# Altium footprint library Connect.PcbLib: 272 footprints (part 17 of 17)
Each footprint in its own frame and in the unit in brackets; x right, y up, seen from the top. Pads: shape width x height; smd on the part's side, far side on the other; paste and mask are expansions set on the pad; w line width, h text height; cw(c..) or ccw(c..) is an arc to the next point about the centre after c.
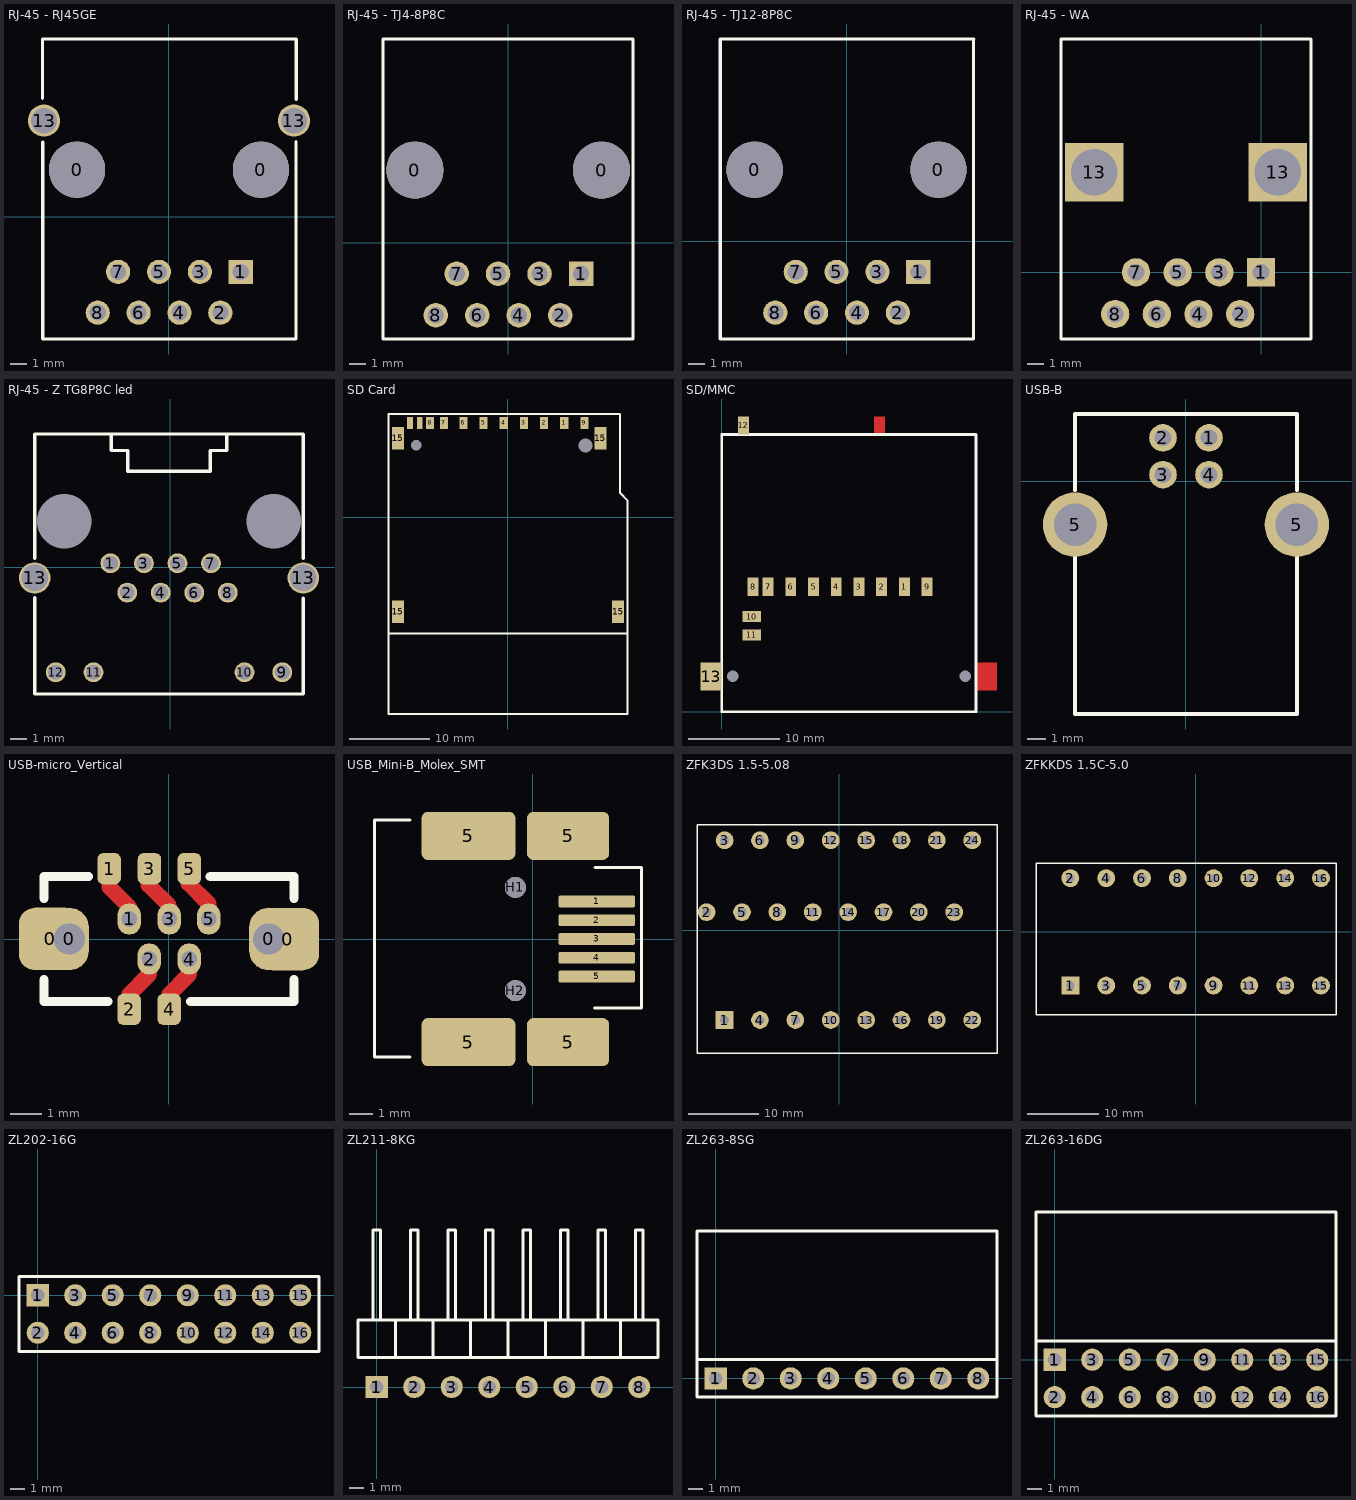
[diagram p16: the footprints below, top view; thin cyan lines are the x and y axes]

## RJ-45 - RJ45GE [mm]
pads (12):
  round 3.5 hole 3.5 unplated: 0(-5.715,2.92) 0(5.715,2.92)
  rect 1.5x1.5 hole 1: 1(4.46,-3.43)
  round 1.5 hole 1: 2(3.19,-5.97) 3(1.92,-3.43) 4(0.65,-5.97) 5(-0.62,-3.43) 6(-1.89,-5.97) 7(-3.16,-3.43) 8(-4.43,-5.97)
  round 2 hole 1.6: 13(-7.77,5.97) 13(7.77,5.97)
Top Overlay:
  lines w0.2: -7.86,7.345 -7.86,11.045 4.74,11.045 7.915,11.045 7.915,7.295 ; -7.855,4.645 -7.855,-7.605 7.895,-7.605 7.895,4.67
3D body "RJ-45 (TJ7-8P8C).STEP": height 13.7, standoff -4, extent -7.975,-7.725 8.025,13.675

## RJ-45 - TJ4-8P8C [mm]
height 11.5
pads (10):
  round 3.5 hole 3.5 unplated: 0(-5.715,4.445) 0(5.715,4.445)
  rect 1.5x1.5 hole 1: 1(4.46,-1.905)
  round 1.5 hole 1: 2(3.19,-4.445) 3(1.92,-1.905) 4(0.65,-4.445) 5(-0.62,-1.905) 6(-1.89,-4.445) 7(-3.16,-1.905) 8(-4.43,-4.445)
Top Overlay:
  lines w0.2: -7.675,-5.9 -7.675,12.475 7.65,12.475 7.65,-5.9 -7.675,-5.9
3D body: height 11.5, standoff 10, extent -7.485,-5.75 0,12.325
3D body: height 0.5, standoff -3.5, extent -7.215,2.945 -4.215,5.945
3D body: height 0.5, standoff 0, extent -7.485,9.75 -3,12.325
3D body: height 0.5, standoff 0, extent -6.635,-4.75 -5.635,2
3D body: height 0.5, standoff 0, extent -4.385,1 4.385,2
3D body: height 2, standoff 0.5, extent -7.485,-5.75 -4.885,12.325
3D body: height 11, standoff 0.5, extent -7.485,-5.75 -6.197,12.325
3D body: height 11, standoff 0.5, extent -7.485,-5.75 7.485,2
3D body: height 11, standoff 0.5, extent 6.197,-5.75 7.485,12.325
3D body: height 2, standoff 0.5, extent 4.885,-5.75 7.485,12.325
3D body: height 0.5, standoff 0, extent 5.635,-4.75 6.635,2
3D body: height 0.5, standoff 0, extent 3,9.75 7.485,12.325
3D body: height 0.5, standoff -3.5, extent 4.215,2.945 7.215,5.945
3D body: height 11.5, standoff 10, extent 0,-5.75 7.485,12.325
3D body: height 1, standoff -3, extent -3.508,-2.254 -2.81,-1.555
3D body: height 1, standoff -3, extent -4.778,-4.794 -4.08,-4.095
3D body: height 1, standoff -3, extent -0.97,-2.255 -0.272,-1.556
3D body: height 1, standoff -3, extent -2.24,-4.795 -1.542,-4.096
3D body: height 1, standoff -3, extent 0.3,-4.795 0.998,-4.096
3D body: height 1, standoff -3, extent 1.57,-2.255 2.268,-1.556
3D body: height 1, standoff -3, extent 4.11,-2.255 4.808,-1.556
3D body: height 1, standoff -3, extent 2.84,-4.795 3.538,-4.096

## RJ-45 - TJ12-8P8C [mm]
pads (10):
  round 3.5 hole 3.5 unplated: 0(-5.715,4.445) 0(5.715,4.445)
  rect 1.5x1.5 hole 1: 1(4.46,-1.905)
  round 1.5 hole 1: 2(3.19,-4.445) 3(1.92,-1.905) 4(0.65,-4.445) 5(-0.62,-1.905) 6(-1.89,-4.445) 7(-3.16,-1.905) 8(-4.43,-4.445)
Top Overlay:
  lines w0.2: -7.86,12.57 4.74,12.57 7.915,12.57 ; -7.855,12.57 -7.855,-6.08 7.895,-6.08 7.895,12.57
3D body "RJ-45_TJ12-8P8C.STEP": height 12.7, standoff -3.36, extent -7.575,-5.844 7.665,12.444

## RJ-45 - WA [mm]
pads (10):
  rect 1.7x1.7 hole 1: 1(0,0)
  round 1.7 hole 1: 2(-1.25,-2.5) 3(-2.5,0) 4(-3.75,-2.5) 5(-5,0) 6(-6.25,-2.5) 7(-7.5,0) 8(-8.75,-2.5)
  rect 3.5x3.5 hole 2.8 unplated: 13(-10,6) 13(1,6)
Top Overlay:
  lines w0.2: -12,-4 -12,14 3,14 3,-4 -12,-4

## RJ-45 - Z TG8P8C led [mm]
pads (16):
  round 0 hole 3.3: 0(-6.425,2.795) 0(6.275,2.795)
  round 1.2 hole 0.9 unplated: 1(-3.625,0.255) 9(6.785,-6.345) 10(4.495,-6.345) 11(-4.645,-6.345) 12(-6.935,-6.345)
  round 1.2 hole 0.9 unplated paste+0: 2(-2.605,-1.525) 3(-1.595,0.255) 4(-0.575,-1.525) 5(0.435,0.255) 6(1.455,-1.525) 7(2.465,0.255) 8(3.485,-1.525)
  round 1.9 hole 1.6: 13(-8.205,-0.635) 13(8.055,-0.635)
Top Overlay:
  lines w0.2: -8.21,0.55 -8.21,8.085 ; -8.205,-1.825 -8.205,-7.665 8.055,-7.665 8.055,-1.85 ; -8.205,8.085 8.055,8.085 8.05,8.085 8.05,0.55 ; -3.575,8.085 -3.575,7.075 -2.575,7.075 -2.575,5.825 2.425,5.825 2.425,7.075 3.425,7.075 3.425,8.075 ; 2.535,8.085 2.635,8.085 ; 4.685,8.085 4.785,8.085
3D body "RJ-45 - Z TG8P8C.STEP": height 14.6, standoff -4.12, extent -9.339,-7.65 9.289,9.071

## SD Card [mm]
pads (17):
  round 0 hole 1.3: 0(-11.4,8.9)
  round 0 hole 1.7: 0(9.6,8.9)
  rect 1x1.5 smd: 1(6.975,11.7) 2(4.475,11.7) 3(1.975,11.7) 4(-0.525,11.7) 5(-3.025,11.7) 6(-5.525,11.7) 7(-7.95,11.7) 8(-9.65,11.7) 9(9.475,11.7)
  rect 0.7x1.5 smd: 11(-10.95,11.7) 14(-12.15,11.7)
  rect 1.5x2.8 smd: 15(-13.65,-11.7) 15(-13.65,9.8) 15(11.45,9.8) 15(13.65,-11.7)
Top Overlay:
  lines w0.25: -14.8,-14.4 -14.8,-24.4 14.8,-24.4 14.8,-14.4
  lines w0.254: -14.8,-14.4 -14.8,12.8 13.9,12.8 13.9,3 14.8,2.1 14.8,-14.4 -14.8,-14.4
3D body "SD Card Connector.STEP": height 3.4, standoff -0.5, extent -13.913,-14.075 14.063,12.175
3D body "User Library-SD Card-1.STEP": height 2.15, standoff 0.85, extent -12,-24.25 12,7.75

## SD/MMC [mm]
height 3.3
pads (15):
  round 0 hole 1.3: 0(1.2,3.9) 0(26.8,3.9)
  rect 1.2x2 smd: 1(20.1,13.75) 2(17.6,13.75) 3(15.1,13.75) 4(12.6,13.75) 5(10.1,13.75) 6(7.6,13.75) 7(5.1,13.75) 8(3.45,13.75) 9(22.6,13.75) 12(2.375,31.5)
  rect 2x1.2 smd: 10(3.3,10.45) 11(3.3,8.45)
  rect 2.3x3.1 smd: 13(-1.175,3.85)
Top Layer:
  rectangle: 28,2.3 30.3,5.4
  region: 17.95,30.5 17.95,32.5 16.75,32.5 16.75,30.5
Top Overlay:
  lines w0.3: 0,0 28,0 28,30.5 0,30.5 0,0

## USB-B [mm]
height 10.6
pads (6):
  round 1.5 hole 0.9: 1(1.25,2.355) 2(-1.25,2.355) 3(-1.25,0.355) 4(1.25,0.355)
  round 3.5 hole 2.3: 5(-6.02,-2.355) 5(6.02,-2.355)
Top Overlay:
  lines w0.2: -6.02,-4.105 -6.02,-12.635 6.02,-12.635 6.02,-4.105 ; -6.02,-0.5 -6.02,3.645 6.02,3.645 6.02,-0.5
3D body "USB-B-S-X-W-TH.STEP": height 11, standoff -3.64, extent -7.4,-12.7 7.399,3.8

## USB-micro_Vertical [mm]
height 10
pads (14):
  rrect50% 2x2 smd: 0(-3.8,0) 0(3.8,0)
  oval 1.25x2 hole 1: 0(-3.19,0) 0(3.19,0)
  rrect50% 0.75x1 smd: 1(-1.915,2.25) 2(-1.275,-2.25) 3(-0.625,2.25) 4(0.005,-2.25) 5(0.65,2.25)
  oval 0.75x1 hole 0.5: 1(-1.27,0.64) 2(-0.63,-0.64) 3(0.01,0.64) 4(0.65,-0.64) 5(1.27,0.64)
Top Layer:
  lines w0.5: -1.915,2.35 -1.915,1.665 -1.27,1.02 -1.27,0.64 ; -1.275,-2.35 -1.275,-1.775 -0.63,-1.13 -0.63,-0.64 ; -0.655,2.35 -0.655,1.73 -0.01,1.085 -0.01,0.64 ; 0.005,-2.35 0.005,-1.775 0.65,-1.13 0.65,-0.64 ; 0.625,2.35 0.625,1.775 1.27,1.13 1.27,0.64
Top Overlay:
  lines w0.3: -4,-1.3 -4,-2 -1.95,-2 ; -4,1.3 -4,2 -2.575,2 ; 0.7,-2 4,-2 4,-1.3 ; 1.325,2 4,2 4,1.3
3D body: height 2, standoff 0, extent -1.635,-1.875 -0.885,-1.85
3D body: height 2, standoff 0, extent -0.355,-1.875 0.395,-1.85
3D body: height 2, standoff 0, extent 0.265,1.85 1.015,1.875
3D body: height 2, standoff 0, extent -0.995,1.85 -0.245,1.875
3D body: height 2, standoff 0, extent -2.275,1.85 -1.525,1.875
3D body: height 3.3, standoff 0, extent -3.85,-1.85 3.85,1.85
3D body: height 11, standoff 0.4, extent -3.425,-0.9 3.425,0.9

## USB_Mini-B_Molex_SMT [mm]
height 3.95
pads (11):
  rrect25% 3.25x0.5 smd: 1(2.738,1.6) 2(2.738,0.8) 3(2.738,0) 4(2.738,-0.8) 5(2.738,-1.6)
  rrect25% 4x2.05 smd: 5(-2.737,-4.4) 5(-2.737,4.4)
  rrect25% 3.5x2.05 smd: 5(1.513,-4.4) 5(1.513,4.4)
  round 0.9 hole 0.9 unplated: H1(-0.737,2.2) H2(-0.737,-2.2)
Top Overlay:
  lines w0.127: -5.237,-5.025 -6.737,-5.025 -6.737,5.075 -5.237,5.075 ; 2.638,-2.95 4.638,-2.95 4.638,3.05 2.663,3.05
3D body "usb_a-usb_b-m5-smd-c.stp": height 3.93, standoff -1, extent -6.662,-4.925 2.587,4.975

## ZFK3DS 1.5-5.08 [mm]
height 36.6
pads (24):
  rect 2.5x2.5 hole 1.3: 1(-16.23,-12.7)
  round 2.5 hole 1.3: 2(-18.77,2.54) 3(-16.23,12.7) 4(-11.23,-12.7) 5(-13.77,2.54) 6(-11.23,12.7) 7(-6.23,-12.7) 8(-8.77,2.54) 9(-6.23,12.7) 10(-1.23,-12.7) 11(-3.77,2.54) 12(-1.23,12.7) 13(3.77,-12.7) 14(1.23,2.54) 15(3.77,12.7) 16(8.77,-12.7) 17(6.23,2.54) 18(8.77,12.7) 19(13.77,-12.7) 20(11.23,2.54) 21(13.77,12.7) 22(18.77,-12.7) 23(16.23,2.54) 24(18.77,12.7)
Top Overlay:
  lines w0.2: -20.13,-17.4 22.27,-17.4 22.27,14.9 -20.13,14.9 -20.13,-17.4
3D body "ZFK3DS 1,5-5,08.stp": height 36.6, standoff -3.5, extent -20.045,-17.35 -13.165,14.85
3D body "ZFK3DS 1,5-5,08.stp": height 36.6, standoff -3.5, extent -15.045,-17.35 -8.165,14.85
3D body "ZFK3DS 1,5-5,08.stp": height 36.6, standoff -3.5, extent -10.045,-17.35 -3.165,14.85
3D body "ZFK3DS 1,5-5,08.stp": height 36.6, standoff -3.5, extent -5.045,-17.35 1.835,14.85
3D body "ZFK3DS 1,5-5,08.stp": height 36.6, standoff -3.5, extent -0.045,-17.35 6.835,14.85
3D body "ZFK3DS 1,5-5,08.stp": height 36.6, standoff -3.5, extent 4.955,-17.35 11.835,14.85
3D body "ZFK3DS 1,5-5,08.stp": height 36.6, standoff -3.5, extent 9.955,-17.35 16.835,14.85
3D body "ZFK3DS 1,5-5,08.stp": height 36.6, standoff -3.5, extent 14.955,-17.35 21.835,14.85

## ZFKKDS 1.5C-5.0 [mm]
height 26
pads (16):
  rect 2.5x2.5 hole 1.2: 1(-17.5,-7.5)
  round 2.5 hole 1.2: 2(-17.5,7.5) 3(-12.5,-7.5) 4(-12.5,7.5) 5(-7.5,-7.5) 6(-7.5,7.5) 7(-2.5,-7.5) 8(-2.5,7.5) 9(2.5,-7.5) 10(2.5,7.5) 11(7.5,-7.5) 12(7.5,7.5) 13(12.5,-7.5) 14(12.5,7.5) 15(17.5,-7.5) 16(17.5,7.5)
Top Overlay:
  lines w0.2: -22.3,-11.6 -22.3,9.6 19.6,9.6 19.6,-11.6 -22.3,-11.6
3D body "ZFKKDS 1,5C-5,0.stp": height 26, standoff -3.7, extent 13.1,-11.5 19.5,9.5
3D body "ZFKKDS 1,5C-5,0.stp": height 26, standoff -3.7, extent 8.1,-11.5 14.5,9.5
3D body "ZFKKDS 1,5C-5,0.stp": height 26, standoff -3.7, extent 3.1,-11.5 9.5,9.5
3D body "ZFKKDS 1,5C-5,0.stp": height 26, standoff -3.7, extent -1.9,-11.5 4.5,9.5
3D body "ZFKKDS 1,5C-5,0.stp": height 26, standoff -3.7, extent -6.9,-11.5 -0.5,9.5
3D body "ZFKKDS 1,5C-5,0.stp": height 26, standoff -3.7, extent -11.9,-11.5 -5.5,9.5
3D body "ZFKKDS 1,5C-5,0.stp": height 26, standoff -3.7, extent -16.9,-11.5 -10.5,9.5
3D body "ZFKKDS 1,5C-5,0.stp": height 26, standoff -3.7, extent -21.9,-11.5 -15.5,9.5

## ZL202-16G [mm] "Connector; Header; 2x8 Position"
height 5
pads (16):
  rect 1.5x1.5 hole 0.9: 1(0,0)
  round 1.5 hole 0.9: 2(0,-2.54) 3(2.54,0) 4(2.54,-2.54) 5(5.08,0) 6(5.08,-2.54) 7(7.62,0) 8(7.62,-2.54) 9(10.16,0) 10(10.16,-2.54) 11(12.7,0) 12(12.7,-2.54) 13(15.24,0) 14(15.24,-2.54) 15(17.78,0) 16(17.78,-2.54)
Top Overlay:
  lines w0.2: -1.27,-3.81 19.05,-3.81 19.05,-1.27 19.05,1.27 -1.27,1.27 -1.27,-1.27 -1.27,-3.81

## ZL211-8KG [mm] "Connector; Header; 8 Position"
height 5
pads (8):
  rect 1.5x1.5 hole 0.9: 1(0,0)
  round 1.5 hole 0.9: 2(2.54,0) 3(5.08,0) 4(7.62,0) 5(10.16,0) 6(12.7,0) 7(15.24,0) 8(17.78,0)
Top Overlay:
  lines w0.2: -0.25,4.54 -0.25,10.64 0.25,10.64 0.25,4.54 ; 1.27,2 1.27,4.54 ; 2.29,4.54 2.29,10.64 2.79,10.64 2.79,4.54 ; 3.81,2 3.81,4.54 ; 4.83,4.54 4.83,10.64 5.33,10.64 5.33,4.54 ; 6.35,2 6.35,4.54 ; 7.37,4.54 7.37,10.64 7.87,10.64 7.87,4.54 ; 8.89,2 8.89,4.54 ; 9.91,4.54 9.91,10.64 10.41,10.64 10.41,4.54 ; 11.43,2 11.43,4.54 ; 12.45,4.54 12.45,10.64 12.95,10.64 12.95,4.54 ; 13.97,2 13.97,4.54 ; 14.99,4.54 14.99,10.64 15.49,10.64 15.49,4.54 ; 16.51,2 16.51,4.54 ; 17.53,4.54 17.53,10.64 18.03,10.64 18.03,4.54 ; -1.27,2 19.05,2 19.05,4.54 -1.27,4.54 -1.27,2

## ZL263-8SG [mm] "Connector; Header; 8 Position"
height 5
pads (8):
  rect 1.5x1.5 hole 0.9: 1(0,0)
  round 1.5 hole 0.9: 2(2.54,0) 3(5.08,0) 4(7.62,0) 5(10.16,0) 6(12.7,0) 7(15.24,0) 8(17.78,0)
Top Overlay:
  lines w0.2: -1.27,1.27 -1.27,10 19.05,10 19.05,1.27 ; -1.27,1.27 -1.27,-1.27 19.05,-1.27 19.05,1.27 ; -1.27,1.27 19.05,1.27

## ZL263-16DG [mm] "Connector; Header; 2x8 Position"
height 5
pads (16):
  rect 1.5x1.5 hole 0.9: 1(0,0)
  round 1.5 hole 0.9: 2(0,-2.54) 3(2.54,0) 4(2.54,-2.54) 5(5.08,0) 6(5.08,-2.54) 7(7.62,0) 8(7.62,-2.54) 9(10.16,0) 10(10.16,-2.54) 11(12.7,0) 12(12.7,-2.54) 13(15.24,0) 14(15.24,-2.54) 15(17.78,0) 16(17.78,-2.54)
Top Overlay:
  lines w0.2: -1.27,1.27 19.05,1.27 ; -1.27,1.27 -1.27,-1.27 -1.27,-3.81 19.05,-3.81 19.05,-1.27 19.05,1.27 ; -1.27,1.27 -1.27,10 19.05,10 19.05,1.27